# Altium footprint library agh_racing_2018.PcbLib: 166 footprints (part 5 of 11)
Each footprint in its own frame and in the unit in brackets; x right, y up, seen from the top. Pads: shape width x height; smd on the part's side, far side on the other; paste and mask are expansions set on the pad; w line width, h text height; cw(c..) or ccw(c..) is an arc to the next point about the centre after c.
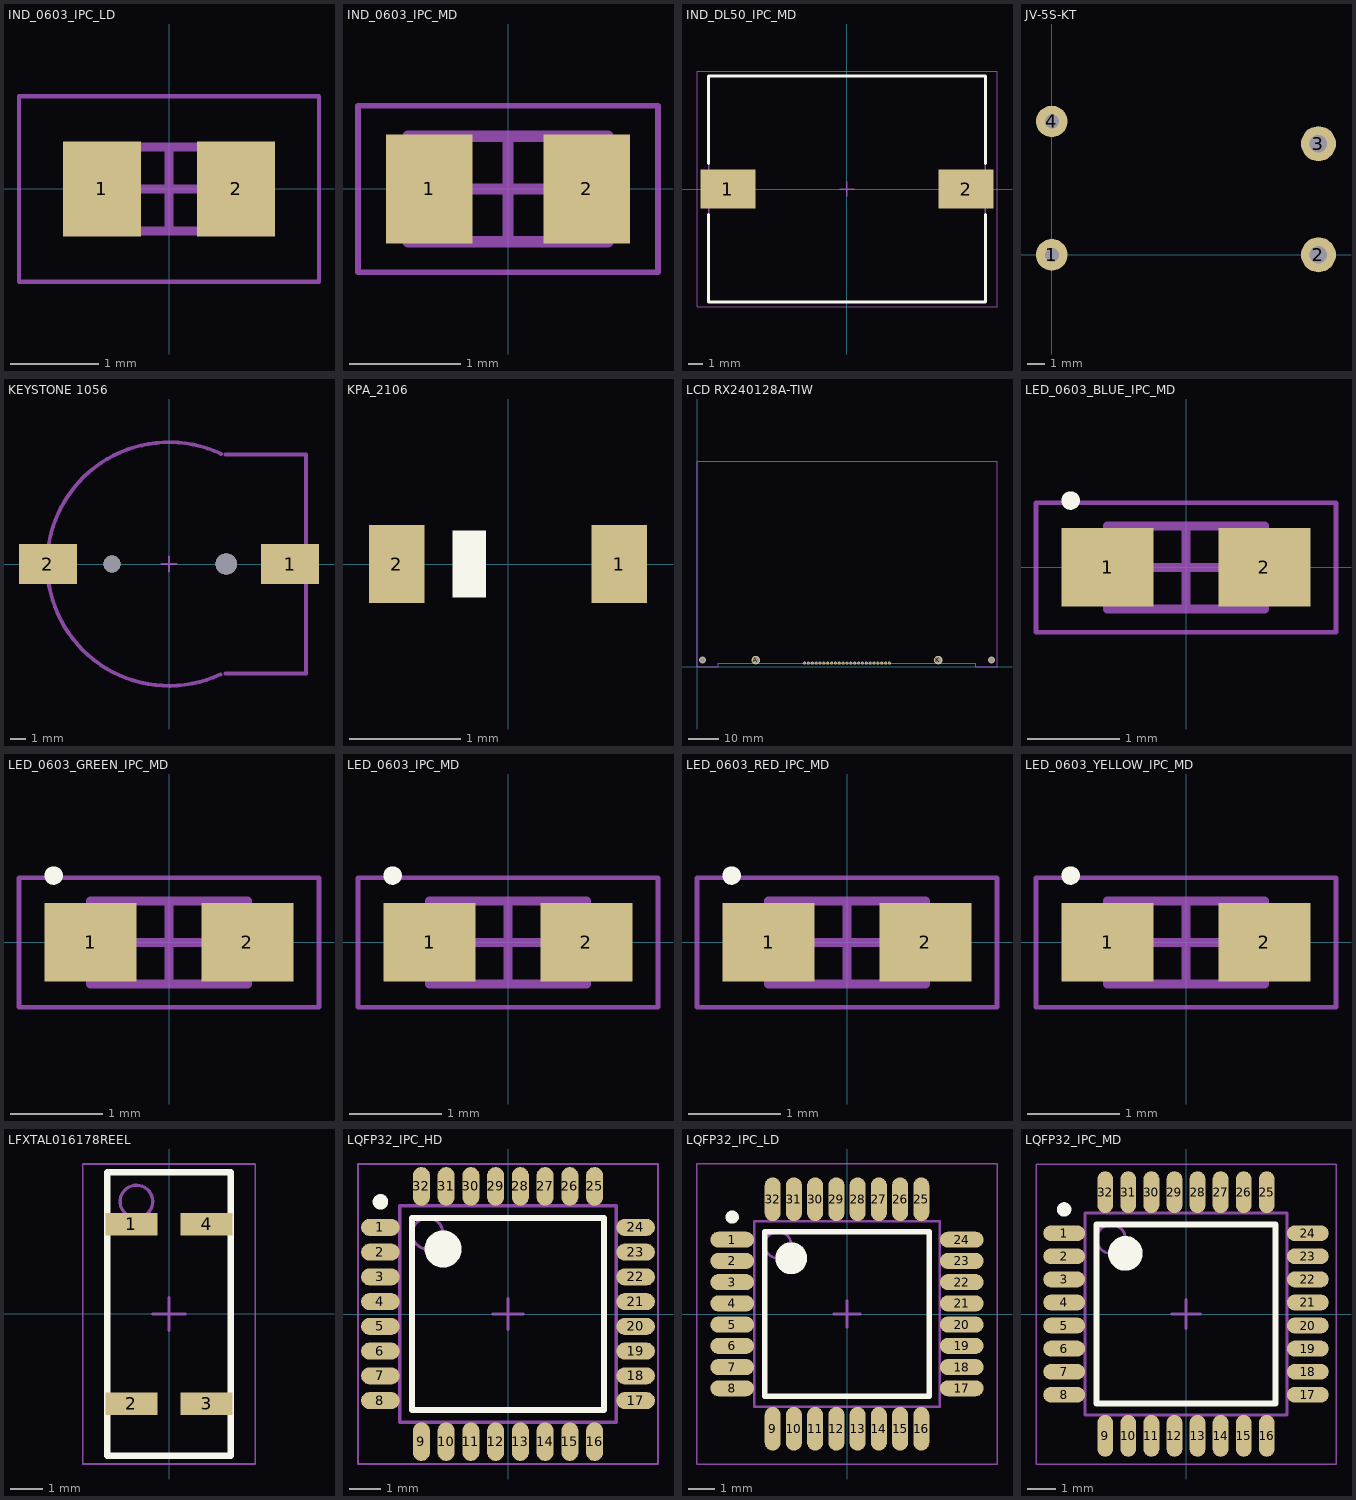
[diagram p4: the footprints below, top view; thin cyan lines are the x and y axes]

## IND_0603_IPC_LD [mm] "Chip Inductor, 2-Leads, Body 1.60x0.80mm, IPC Low Density"
height 0.95
pads (2):
  rect 0.88x1.08 smd: 1(-0.76,0) 2(0.76,0)
Mechanical 13:
  lines w0.1: -0.9,-0.475 0.9,-0.475 0.9,0.475 -0.9,0.475 -0.9,-0.475
Mechanical 15:
  lines w0.05: -1.7,-1.05 1.7,-1.05 1.7,1.05 -1.7,1.05 -1.7,-1.05
  lines w0.1: -0.475,0 0.475,0 ; 0,-0.475 0,0.475
3D body "IND_0603_IPC_LD.step": height 0.95, standoff 0, extent -0.9,-0.475 0.9,0.475

## IND_0603_IPC_MD [mm] "Chip Inductor, 2-Leads, Body 1.60x0.80mm, IPC Medium Density"
height 0.95
pads (2):
  rect 0.78x0.98 smd: 1(-0.71,0) 2(0.71,0)
Mechanical 13:
  lines w0.1: -0.9,-0.475 0.9,-0.475 0.9,0.475 -0.9,0.475 -0.9,-0.475
Mechanical 15:
  lines w0.05: -1.35,-0.75 1.35,-0.75 1.35,0.75 -1.35,0.75 -1.35,-0.75
  lines w0.1: -0.475,0 0.475,0 ; 0,-0.475 0,0.475
3D body "IND_0603_IPC_MD.step": height 0.95, standoff 0, extent -0.9,-0.475 0.9,0.475

## IND_DL50_IPC_MD [mm] "DL50, Inductor, Ferrocore, IPC Medium Density"
height 7.11
pads (2):
  rect 3.7x2.65 smd: 1(-8,0) 2(8,0)
Top Overlay:
  lines w0.2: -9.3,-1.725 -9.3,-7.6 9.3,-7.6 9.3,-1.725 ; -9.3,1.725 -9.3,7.6 9.3,7.6 9.3,1.725
Mechanical 13:
  lines w0.1: -9.27,-7.62 -9.27,7.62 9.27,7.62 9.27,-7.62 -9.27,-7.62
Mechanical 15:
  lines w0.05: -10.075,-7.9 -10.075,7.9 10.075,7.9 10.075,-7.9 -10.075,-7.9
  lines w0.1: -0.5,0 0.5,0 ; 0,-0.5 0,0.5
3D body "IND_DL50_IPC_MD.step": height 7.21, standoff 0, extent -9.18,-7.62 9.18,7.62

## JV-5S-KT [mm] "Relay mini, PCB"
height 12.5
pads (4):
  round 1.8 hole 0.8: 1(0,0) 4(0,7.62)
  round 2 hole 1: 2(15.24,0) 3(15.24,6.35)
3D body "relay_mini.SLDPRT": height 12.51, standoff -3.79, extent -1.33,-1.19 16.17,8.81

## KEYSTONE 1056 [mm] "KEYSTONE KEYS1056  for  BR1220, CR1220 batteries, 4mm height, SMD"
height 4
pads (2):
  rect 3.8x2.6 smd: 1(7.95,0) 2(-7.95,0)
via 3.75,0 diameter 1.4 hole 1.4
via -3.75,0 diameter 1.1 hole 1.1
Mechanical 15:
  lines w0.1: -0.5,0 0.5,0 ; 0,-0.5 0,0.5
  lines w0.254: 3.378,-7.252 cw(c0,0) 3.416,7.234 ; 3.7,-7.2 9,-7.2 9,7.2 3.7,7.2
3D body "User Library-Battery Holder for CR1220 SMD.STEP": height 4.23, standoff -0.52, extent -9.125,-7.4 9.675,7.349

## KPA_2106 [mm]
pads (2):
  rect 0.5x0.7 smd: 1(1,0) 2(-1,0)
Top Overlay:
  rectangle: -0.5,-0.3 -0.2,0.3
3D body: height 0.6, standoff 0, extent -1,-0.25 1,0.75

## LCD RX240128A-TIW [mm] "LCD Footprint"
pads (25):
  round 1.016 hole 0.6: 1(35.38,1.23) 2(36.65,1.23) 3(37.92,1.23) 4(39.19,1.23) 5(40.46,1.23) 6(41.73,1.23) 7(43,1.23) 8(44.27,1.23) 9(45.54,1.23) 10(46.81,1.23) 11(48.08,1.23) 12(49.35,1.23) 13(50.62,1.23) 14(51.89,1.23) 15(53.16,1.23) 16(54.43,1.23) 17(55.7,1.23) 18(56.97,1.23) 19(58.24,1.23) 20(59.51,1.23) 21(60.78,1.23) 22(62.05,1.23) 23(63.32,1.23)
  round 2.8 hole 2: A(19.35,2.25) K(79.35,2.25)
via 96.87,2.25 diameter 2.2 hole 1.7
via 1.83,2.25 diameter 2.2 hole 1.7
Mechanical 13:
  lines w0.254: 0,0 7,0 7,1.2 91.7,1.2 91.7,0 98.7,0 98.7,67.7 0,67.7 0,0
3D body "LCD.STEP": height 5.7, standoff -4.9, extent 0.001,0 98.701,67.7

## LED_0603_BLUE_IPC_MD [mm] "Molded Diode, 2-Leads, Body 1,60x0,80mm, IPC Medium Density"
height 0.5
pads (2):
  rect 1x0.85 smd: 1(-0.85,0) 2(0.85,0)
Top Overlay:
  circle w0.1: c-1.25,0.725 r0.05
Mechanical 13:
  rectangle: -0.85,-0.45 -0.621,0.45
  lines w0.1: -0.85,-0.45 0.85,-0.45 0.85,0.45 -0.85,0.45 -0.85,-0.45
Mechanical 15:
  lines w0.05: -1.625,-0.7 1.625,-0.7 1.625,0.7 -1.625,0.7 -1.625,-0.7
  lines w0.1: -0.45,0 0.45,0 ; 0,-0.45 0,0.45
3D body "LED 0603 blue.STEP": height 0.7, standoff -0.01, extent -0.8,-0.4 0.8,0.387

## LED_0603_GREEN_IPC_MD [mm] "Molded Diode, 2-Leads, Body 1,60x0,80mm, IPC Medium Density"
height 0.5
pads (2):
  rect 1x0.85 smd: 1(-0.85,0) 2(0.85,0)
Top Overlay:
  circle w0.1: c-1.25,0.725 r0.05
Mechanical 13:
  rectangle: -0.85,-0.45 -0.621,0.45
  lines w0.1: -0.85,-0.45 0.85,-0.45 0.85,0.45 -0.85,0.45 -0.85,-0.45
Mechanical 15:
  lines w0.05: -1.625,-0.7 1.625,-0.7 1.625,0.7 -1.625,0.7 -1.625,-0.7
  lines w0.1: -0.45,0 0.45,0 ; 0,-0.45 0,0.45
3D body "LED 0603 green.STEP": height 0.7, standoff -0.01, extent -0.8,-0.394 0.8,0.394

## LED_0603_IPC_MD [mm] "Molded Diode, 2-Leads, Body 1,60x0,80mm, IPC Medium Density"
height 0.5
pads (2):
  rect 1x0.85 smd: 1(-0.85,0) 2(0.85,0)
Top Overlay:
  circle w0.1: c-1.25,0.725 r0.05
Mechanical 13:
  rectangle: -0.85,-0.45 -0.621,0.45
  lines w0.1: -0.85,-0.45 -0.85,0.45 0.85,0.45 0.85,-0.45 -0.85,-0.45
Mechanical 15:
  lines w0.05: -1.625,-0.7 -1.625,0.7 1.625,0.7 1.625,-0.7 -1.625,-0.7
  lines w0.1: -0.45,0 0.45,0 ; 0,-0.45 0,0.45
3D body "LED_0805_IPC_MD.step": height 0.5, standoff 0, extent -1.07,-0.45 1.07,0.45

## LED_0603_RED_IPC_MD [mm] "Molded Diode, 2-Leads, Body 1,60x0,80mm, IPC Medium Density"
height 0.5
pads (2):
  rect 1x0.85 smd: 1(-0.85,0) 2(0.85,0)
Top Overlay:
  circle w0.1: c-1.25,0.725 r0.05
Mechanical 13:
  rectangle: -0.85,-0.45 -0.621,0.45
  lines w0.1: -0.85,-0.45 0.85,-0.45 0.85,0.45 -0.85,0.45 -0.85,-0.45
Mechanical 15:
  lines w0.05: -1.625,-0.7 1.625,-0.7 1.625,0.7 -1.625,0.7 -1.625,-0.7
  lines w0.1: -0.45,0 0.45,0 ; 0,-0.45 0,0.45
3D body "LED 0603 red.STEP": height 0.7, standoff -0.01, extent -0.8,-0.394 0.8,0.394

## LED_0603_YELLOW_IPC_MD [mm] "Molded Diode, 2-Leads, Body 1,60x0,80mm, IPC Medium Density"
height 0.5
pads (2):
  rect 1x0.85 smd: 1(-0.85,0) 2(0.85,0)
Top Overlay:
  circle w0.1: c-1.25,0.725 r0.05
Mechanical 13:
  rectangle: -0.85,-0.45 -0.621,0.45
  lines w0.1: -0.85,-0.45 -0.85,0.45 0.85,0.45 0.85,-0.45 -0.85,-0.45
Mechanical 15:
  lines w0.05: -1.625,-0.7 -1.625,0.7 1.625,0.7 1.625,-0.7 -1.625,-0.7
  lines w0.1: -0.45,0 0.45,0 ; 0,-0.45 0,0.45
3D body "LED 0603 yellow.STEP": height 0.7, standoff -0.01, extent -0.8,-0.394 0.8,0.394

## LFXTAL016178REEL [mm] "4-Leads, Body 8,70x3,80mm"
height 2.6
pads (4):
  rect 1.6x0.7 smd: 1(-1.15,2.75) 2(-1.15,-2.75) 3(1.15,-2.75) 4(1.15,2.75)
Top Overlay:
  circle w0.25: c-1.3,2.8 r0.125
  lines w0.2: -1.9,-4.35 -1.9,4.35 1.9,4.35 1.9,-4.35 -1.9,-4.35
Mechanical 13:
  circle w0.1: c-1,3.45 r0.5
  lines w0.1: -1.9,-4.35 -1.9,4.35 1.9,4.35 1.9,-4.35 -1.9,-4.35
Mechanical 15:
  lines w0.05: -2.65,-4.6 -2.65,4.6 2.65,4.6 2.65,-4.6 -2.65,-4.6
  lines w0.1: -0.5,0 0.5,0 ; 0,-0.5 0,0.5
3D body "ABRACON_ABS25-32.768KHZ-6-T.STEP": height 2.66, standoff 0, extent -2,-4 2,4

## LQFP32_IPC_HD [mm] "TQFP, 32-Leads, Body 7.00x7.00mm, Pitch 0.80mm, IPC High Density"
height 1.6
pads (32):
  oval 1.25x0.55 smd: 1(-4.125,2.8) 2(-4.125,2) 3(-4.125,1.2) 4(-4.125,0.4) 5(-4.125,-0.4) 6(-4.125,-1.2) 7(-4.125,-2) 8(-4.125,-2.8) 17(4.125,-2.8) 18(4.125,-2) 19(4.125,-1.2) 20(4.125,-0.4) 21(4.125,0.4) 22(4.125,1.2) 23(4.125,2) 24(4.125,2.8)
  oval 0.55x1.25 smd: 9(-2.8,-4.125) 10(-2,-4.125) 11(-1.2,-4.125) 12(-0.4,-4.125) 13(0.4,-4.125) 14(1.2,-4.125) 15(2,-4.125) 16(2.8,-4.125) 25(2.8,4.125) 26(2,4.125) 27(1.2,4.125) 28(0.4,4.125) 29(-0.4,4.125) 30(-1.2,4.125) 31(-2,4.125) 32(-2.8,4.125)
Top Overlay:
  circle w0.25: c-4.125,3.625 r0.125
  circle w0.6: c-2.1,2.1 r0.3
  lines w0.2: -3.1,-3.1 -3.1,3.1 3.1,3.1 3.1,-3.1 -3.1,-3.1
Mechanical 13:
  circle w0.1: c-2.6,2.6 r0.5
  lines w0.1: -3.5,-3.5 -3.5,3.5 3.5,3.5 3.5,-3.5 -3.5,-3.5
Mechanical 15:
  lines w0.05: -4.85,-4.85 -4.85,4.85 4.85,4.85 4.85,-4.85 -4.85,-4.85
  lines w0.1: -0.5,0 0.5,0 ; 0,-0.5 0,0.5
3D body "LQFP32_IPC_HD.step": height 1.6, standoff 0, extent -4.5,-4.5 4.5,4.5

## LQFP32_IPC_LD [mm] "TQFP, 32-Leads, Body 7.00x7.00mm, Pitch 0.80mm, IPC Low Density"
height 1.6
pads (32):
  oval 1.65x0.6 smd: 1(-4.325,2.8) 2(-4.325,2) 3(-4.325,1.2) 4(-4.325,0.4) 5(-4.325,-0.4) 6(-4.325,-1.2) 7(-4.325,-2) 8(-4.325,-2.8) 17(4.325,-2.8) 18(4.325,-2) 19(4.325,-1.2) 20(4.325,-0.4) 21(4.325,0.4) 22(4.325,1.2) 23(4.325,2) 24(4.325,2.8)
  oval 0.6x1.65 smd: 9(-2.8,-4.325) 10(-2,-4.325) 11(-1.2,-4.325) 12(-0.4,-4.325) 13(0.4,-4.325) 14(1.2,-4.325) 15(2,-4.325) 16(2.8,-4.325) 25(2.8,4.325) 26(2,4.325) 27(1.2,4.325) 28(0.4,4.325) 29(-0.4,4.325) 30(-1.2,4.325) 31(-2,4.325) 32(-2.8,4.325)
Top Overlay:
  circle w0.25: c-4.325,3.65 r0.125
  circle w0.6: c-2.1,2.1 r0.3
  lines w0.2: -3.1,-3.1 -3.1,3.1 3.1,3.1 3.1,-3.1 -3.1,-3.1
Mechanical 13:
  circle w0.1: c-2.6,2.6 r0.5
  lines w0.1: -3.5,-3.5 -3.5,3.5 3.5,3.5 3.5,-3.5 -3.5,-3.5
Mechanical 15:
  lines w0.05: -5.65,-5.65 -5.65,5.65 5.65,5.65 5.65,-5.65 -5.65,-5.65
  lines w0.1: -0.5,0 0.5,0 ; 0,-0.5 0,0.5
3D body "LQFP32_IPC_LD.step": height 1.6, standoff 0, extent -4.5,-4.5 4.5,4.5

## LQFP32_IPC_MD [mm] "TQFP, 32-Leads, Body 7.00x7.00mm, Pitch 0.80mm, IPC Medium Density"
height 1.6
pads (32):
  oval 1.45x0.55 smd: 1(-4.225,2.8) 2(-4.225,2) 3(-4.225,1.2) 4(-4.225,0.4) 5(-4.225,-0.4) 6(-4.225,-1.2) 7(-4.225,-2) 8(-4.225,-2.8) 17(4.225,-2.8) 18(4.225,-2) 19(4.225,-1.2) 20(4.225,-0.4) 21(4.225,0.4) 22(4.225,1.2) 23(4.225,2) 24(4.225,2.8)
  oval 0.55x1.45 smd: 9(-2.8,-4.225) 10(-2,-4.225) 11(-1.2,-4.225) 12(-0.4,-4.225) 13(0.4,-4.225) 14(1.2,-4.225) 15(2,-4.225) 16(2.8,-4.225) 25(2.8,4.225) 26(2,4.225) 27(1.2,4.225) 28(0.4,4.225) 29(-0.4,4.225) 30(-1.2,4.225) 31(-2,4.225) 32(-2.8,4.225)
Top Overlay:
  circle w0.25: c-4.225,3.625 r0.125
  circle w0.6: c-2.1,2.1 r0.3
  lines w0.2: -3.1,-3.1 -3.1,3.1 3.1,3.1 3.1,-3.1 -3.1,-3.1
Mechanical 13:
  circle w0.1: c-2.6,2.6 r0.5
  lines w0.1: -3.5,-3.5 -3.5,3.5 3.5,3.5 3.5,-3.5 -3.5,-3.5
Mechanical 15:
  lines w0.05: -5.2,-5.2 -5.2,5.2 5.2,5.2 5.2,-5.2 -5.2,-5.2
  lines w0.1: -0.5,0 0.5,0 ; 0,-0.5 0,0.5
3D body "LQFP32_IPC_MD.step": height 1.6, standoff 0, extent -4.5,-4.5 4.5,4.5